# Altium footprint library MyPcbLib.PcbLib: 237 footprints (part 7 of 15)
Each footprint in its own frame and in the unit in brackets; x right, y up, seen from the top. Pads: shape width x height; smd on the part's side, far side on the other; paste and mask are expansions set on the pad; w line width, h text height; cw(c..) or ccw(c..) is an arc to the next point about the centre after c.
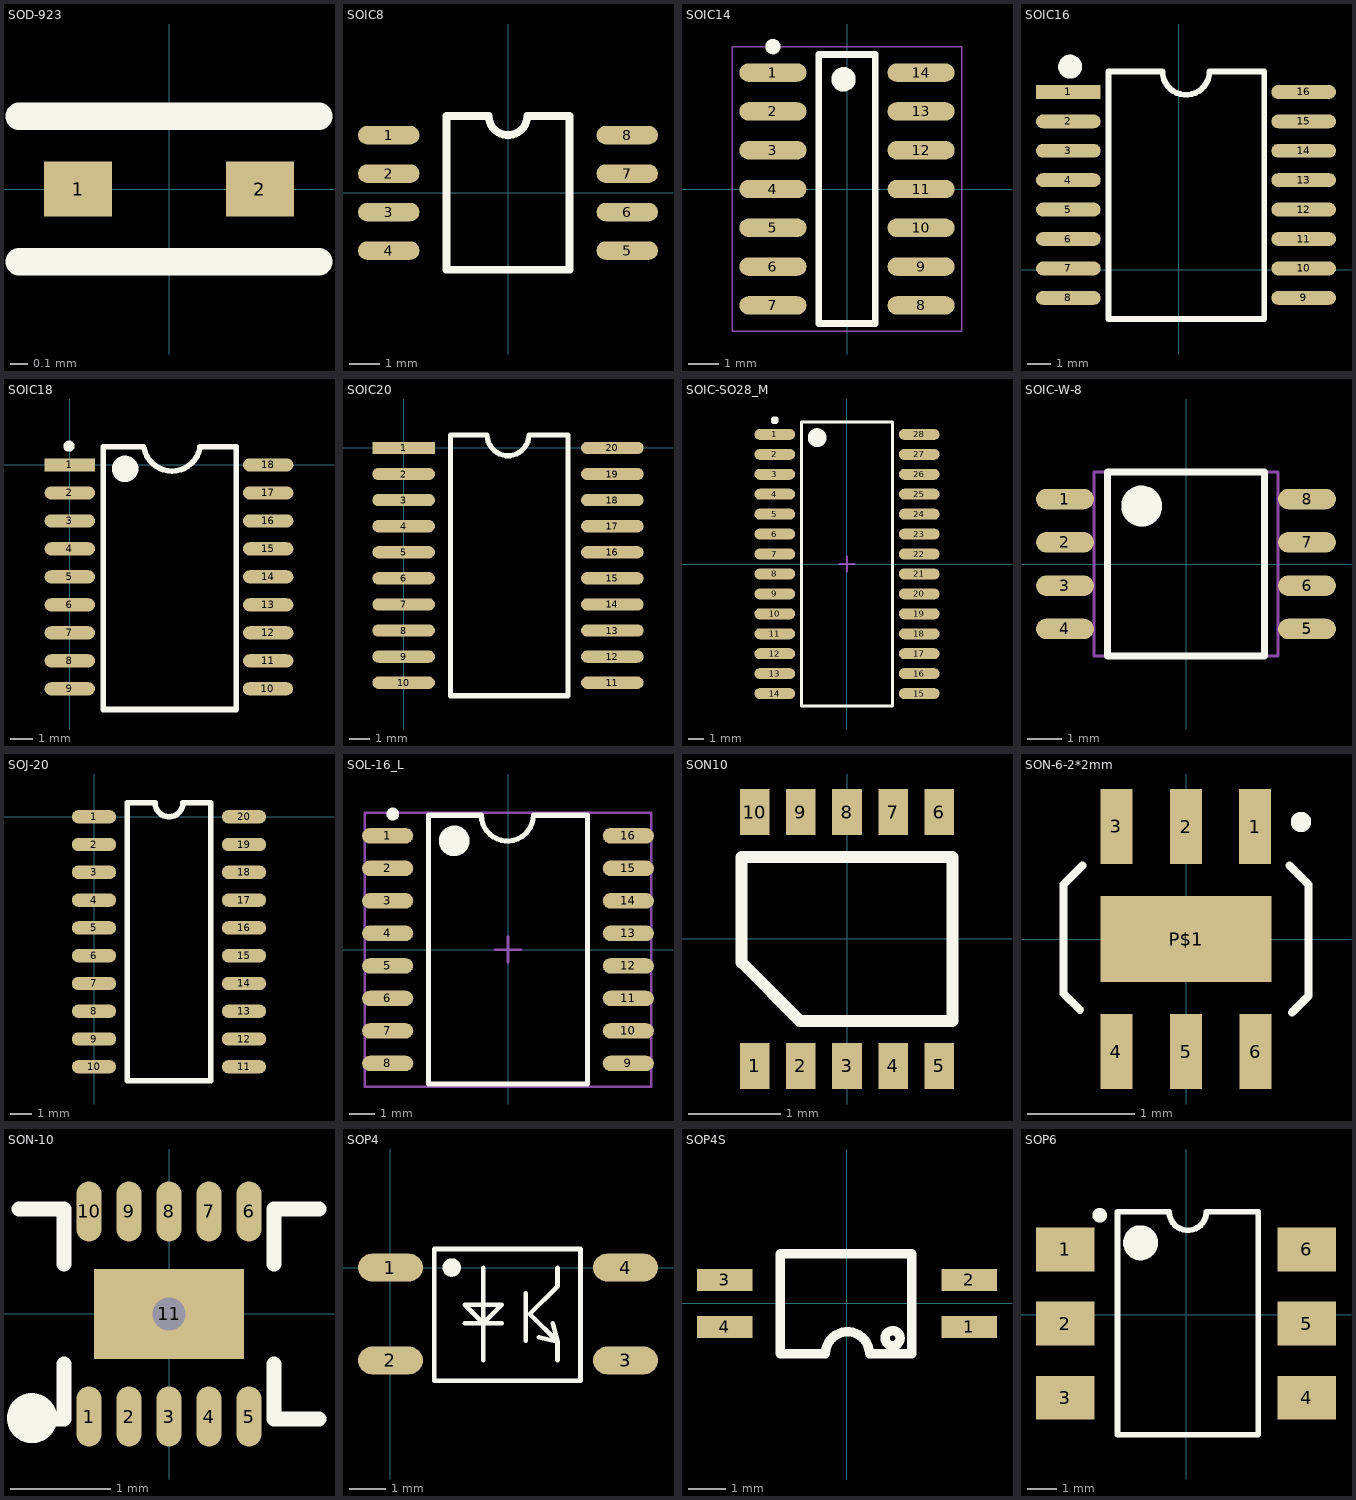
[diagram p6: the footprints below, top view; thin cyan lines are the x and y axes]

## SOD-923 [mil]
pads (2):
  rect 15x12 smd: 1(-20,0) 2(20,0)
Top Overlay:
  lines w6: -33,-16 33,-16 ; -33,16 33,16
3D body "SOD-923.STEP": height 15.75, standoff 0, extent -20.87,-12.7 20.47,12.8

## SOIC8 [mil]
pads (8):
  oval 80x24 smd: 1(-155,75) 2(-155,25) 3(-155,-25) 4(-155,-75) 5(155,-75) 6(155,-25) 7(155,25) 8(155,75)
Top Overlay:
  lines w10: -80,-100 -80,100 -25,100 ccw(c0,100) 25,100 80,100 80,-100 -80,-100
3D body "SOIC8.STEP": height 90.55, standoff -0.78, extent -167.2,-105.9 163.21,105.91

## SOIC14 [mm]
height 1.75
pads (14):
  oval 2.2x0.6 smd: 1(-2.425,3.81) 2(-2.425,2.54) 3(-2.425,1.27) 4(-2.425,0) 5(-2.425,-1.27) 6(-2.425,-2.54) 7(-2.425,-3.81) 8(2.425,-3.81) 9(2.425,-2.54) 10(2.425,-1.27) 11(2.425,0) 12(2.425,1.27) 13(2.425,2.54) 14(2.425,3.81)
Top Overlay:
  circle w0.4: c-0.115,3.59 r0.2
  circle w0.25: c-2.425,4.66 r0.125
  lines w0.22: -0.925,-4.4 0.925,-4.4 0.925,4.4 -0.925,4.4 -0.925,-4.4
Mechanical 15:
  lines w0.05: -3.75,-4.65 3.75,-4.65 3.75,4.65 -3.75,4.65 -3.75,-4.65
3D body "SOIC14.STEP": height 1.75, standoff 0, extent -2.896,-4.237 2.904,4.293

## SOIC16 [mil]
pads (16):
  rect 110x23.62 smd: 1(-188,302)
  oval 110x23.62 smd: 2(-188,252) 3(-188,202) 4(-188,152) 5(-188,102) 6(-188,52) 7(-188,2) 8(-188,-48) 9(212,-48) 10(212,2) 11(212,52) 12(212,102) 13(212,152) 14(212,202) 15(212,252) 16(212,302)
Top Overlay:
  lines w10: -120,335 -120,-84 145,-84 145,335 ; -120,337 -28,337 ccw(c12,337) 52,337 145,337
  lines w20: -195.28,345.79 ccw(c-185,345) -194.93,347.77
3D body "User Library-SOIC16_Wide_JEDEC_MS-013AA.step": height 108.23, standoff 3.9, extent -194.25,-79.69 224.25,333.69

## SOIC18 [mm]
height 2.36
pads (18):
  rect 2.286x0.6 smd: 1(0,0)
  oval 2.286x0.6 smd: 2(0,-1.27) 3(0,-2.54) 4(0,-3.81) 5(0,-5.08) 6(0,-6.35) 7(0,-7.62) 8(0,-8.89) 9(0,-10.16) 10(8.989,-10.16) 11(8.999,-8.89) 12(8.999,-7.62) 13(8.999,-6.35) 14(8.999,-5.08) 15(8.999,-3.81) 16(8.999,-2.54) 17(8.999,-1.27) 18(8.999,0)
Top Overlay:
  circle w0.25: c-0.041,0.85 r0.125
  circle w0.6: c2.509,-0.18 r0.3
  lines w0.254: 3.34,0.82 1.509,0.82 1.509,-11.1 7.559,-11.1 7.559,0.82 5.906,0.82 ; 3.364,0.764 ccw(c4.635,1.014) 5.906,0.762
3D body "PIC16F819-I-SOIC18 (1).step": height 2.31, standoff -0.2, extent -0.686,-10.845 9.654,0.685

## SOIC20 [mm]
pads (20):
  rect 3.048x0.6 smd: 1(0,0)
  oval 3.048x0.6 smd: 2(0,-1.27) 3(0,-2.54) 4(0,-3.81) 5(0,-5.08) 6(0,-6.35) 7(0,-7.62) 8(0,-8.89) 9(0,-10.16) 10(0,-11.43) 11(10.16,-11.43) 12(10.16,-10.16) 13(10.16,-8.89) 14(10.16,-7.62) 15(10.16,-6.35) 16(10.16,-5.08) 17(10.16,-3.81) 18(10.16,-2.54) 19(10.16,-1.27) 20(10.16,0)
Top Overlay:
  lines w0.254: 2.286,-12.065 8.001,-12.065 8.001,0.635 6.096,0.635 cw(c5.08,0.635) 4.064,0.635 2.286,0.635 2.286,-12.065
3D body "User Library-SOIC20-300.STEP": height 2.65, standoff 0, extent -0.045,-12.09 10.255,0.71

## SOIC-SO28_M [mm] "SOIC, 28-Leads, Body 17.9x7.5mm, Pitch 1.27mm, IPC Low Density"
height 2.65
pads (28):
  oval 2.6x0.7 smd: 1(-4.6,8.255) 2(-4.6,6.985) 3(-4.6,5.715) 4(-4.6,4.445) 5(-4.6,3.175) 6(-4.6,1.905) 7(-4.6,0.635) 8(-4.6,-0.635) 9(-4.6,-1.905) 10(-4.6,-3.175) 11(-4.6,-4.445) 12(-4.6,-5.715) 13(-4.6,-6.985) 14(-4.6,-8.255) 15(4.6,-8.255) 16(4.6,-6.985) 17(4.6,-5.715) 18(4.6,-4.445) 19(4.6,-3.175) 20(4.6,-1.905) 21(4.6,-0.635) 22(4.6,0.635) 23(4.6,1.905) 24(4.6,3.175) 25(4.6,4.445) 26(4.6,5.715) 27(4.6,6.985) 28(4.6,8.255)
Top Overlay:
  circle w0.6: c-1.9,8.05 r0.3
  circle w0.25: c-4.6,9.155 r0.125
  lines w0.2: -2.9,-9.05 2.9,-9.05 2.9,9.05 -2.9,9.05 -2.9,-9.05
Mechanical 15:
  lines w0.1: -0.5,0 0.5,0 ; 0,-0.5 0,0.5
3D body "User Library-80072036 SO28.STEP": height 2.63, standoff -0.01, extent -5.36,-9.012 5.31,9.068

## SOIC-W-8 [mm]
pads (8):
  oval 1.7x0.6 smd: 1(-3.55,1.905) 2(-3.55,0.635) 3(-3.55,-0.635) 4(-3.55,-1.905) 5(3.55,-1.905) 6(3.55,-0.635) 7(3.55,0.635) 8(3.55,1.905)
Top Overlay:
  circle w0.6: c-1.3,1.7 r0.3
  lines w0.2: -2.3,-2.7 2.3,-2.7 2.3,2.7 -2.3,2.7 -2.3,-2.7
Mechanical 13:
  circle w0.1: c-1.27,1.651 r0.5
  lines w0.1: -2.7,-2.7 2.7,-2.7 2.7,2.7 -2.7,2.7 -2.7,-2.7
3D body "SOIC-W-8.step": height 2.16, standoff 0, extent -3.95,-2.7 3.95,2.7

## SOJ-20 [mil]
pads (20):
  oval 80x24 smd: 1(0,0) 2(0,-50) 3(0,-100) 4(0,-150) 5(0,-200) 6(0,-250) 7(0,-300) 8(0,-350) 9(0,-400) 10(0,-450) 11(270,-450) 12(270,-400) 13(270,-350) 14(270,-300) 15(270,-250) 16(270,-200) 17(270,-150) 18(270,-100) 19(270,-50) 20(270,0)
Top Overlay:
  lines w10: 60,-475 60,25 110,25 ccw(c135,25) 160,25 210,25 210,-475 60,-475
3D body "Soj20.STEP": height 78.74, standoff 0, extent -6.64,-468.36 275.4,23.77

## SOL-16_L [mm] "16-Pin Small Outline Integrated Circuit 1.27 mm Pitch, IPC High Density"
height 2.65
pads (16):
  oval 2x0.6 smd: 1(-4.7,4.445) 2(-4.7,3.175) 3(-4.7,1.905) 4(-4.7,0.635) 5(-4.7,-0.635) 6(-4.7,-1.905) 7(-4.7,-3.175) 8(-4.7,-4.445) 9(4.7,-4.445) 10(4.7,-3.175) 11(4.7,-1.905) 12(4.7,-0.635) 13(4.7,0.635) 14(4.7,1.905) 15(4.7,3.175) 16(4.7,4.445)
Top Overlay:
  circle w0.25: c-4.5,5.295 r0.125
  circle w0.6: c-2.1,4.25 r0.3
  lines w0.2: -1.084,5.25 -3.1,5.25 -3.1,-5.25 3.1,-5.25 3.1,5.25 1.008,5.25 ; -1.042,5.25 ccw(c-0.025,5.258) 0.991,5.258
Mechanical 15:
  lines w0.1: -0.5,0 0.5,0 ; 0,-0.5 0,0.5 ; -5.6,-5.35 -5.6,5.35 5.6,5.35 5.6,-5.35 -5.6,-5.35
3D body "User Library-SOIC16-300.STEP": height 2.65, standoff 0, extent -5.182,-5.144 5.118,5.156

## SON10 [mm]
pads (10):
  rect 0.32x0.5 smd: 1(-1,-1.375) 2(-0.5,-1.375) 3(0,-1.375) 4(0.5,-1.375) 5(1,-1.375) 6(1,1.375) 7(0.5,1.375) 8(0,1.375) 9(-0.5,1.375) 10(-1,1.375)
Top Overlay:
  lines w0.127: -1.143,-0.254 -0.508,-0.889 1.143,-0.889 1.143,0.889 -1.143,0.889 -1.143,-0.254
3D body "User Library-DRC (S-PVSON-N10)-1.STEP": height 1, standoff 0, extent -1.575,-1.6 1.575,1.55

## SON-6-2*2mm [mm] "SON PAKCAGE [TPS62291]"
pads (7):
  rect 0.3x0.7 smd: 1(0.645,1.05) 2(0,1.05) 3(-0.65,1.05) 4(-0.65,-1.05) 5(0,-1.05) 6(0.65,-1.05)
  rect 1.6x0.8 smd: P$1(0,0)
Top Overlay:
  circle w0.1: c1.073,1.092 r0.045
  lines w0.076: -0.991,-0.66 -1.143,-0.508 -1.143,0.508 -0.965,0.686 ; 0.965,0.686 1.143,0.508 1.143,-0.533 0.991,-0.686
3D body "User Library-QFN6.STEP": height 0.75, standoff 0, extent -1,-0.972 1,1.03

## SON-10 [mm]
height 0.8
pads (11):
  oval 0.25x0.6 smd: 1(-0.8,-1.025) 2(-0.4,-1.025) 3(0,-1.025) 4(0.4,-1.025) 5(0.8,-1.025) 6(0.8,1.025) 7(0.4,1.025) 8(0,1.025) 9(-0.4,1.025) 10(-0.8,1.025)
  rect 1.5x0.9 smd: 11(0,0)
via 0,0 diameter 0.66 hole 0.33
Top Overlay:
  circle w0.25: c-1.37,-1.041 r0.125
  lines w0.152: -1.5,-1.05 -1.05,-1.05 -1.05,-0.5 ; -1.5,1.05 -1.05,1.05 -1.05,0.5 ; 1.05,-0.5 1.05,-1.05 1.5,-1.05 ; 1.05,0.5 1.05,1.05 1.5,1.05
3D body "SON-10.STEP": height 0.8, standoff 0, extent -1.05,-1.055 1.05,1.055

## SOP4 [mil] "AQY211G2S"
pads (4):
  oval 70x30 smd: 1(0,0) 2(0,-100) 3(253.23,-100) 4(253.23,0)
Top Overlay:
  circle w10: c65.94,0 r4.92
  lines w5: 80,-60 120,-60 ; 100,-100 100,0 ; 145.67,-78.74 145.67,-27.56 ; 160,-75 180,-80 ; 175,-60 180,-80 ; 180,-100 180,-80 ; 180,0 180,-20 150,-50 180,-80 ; 47.24,-121.73 47.24,20 204.72,20 204.72,-121.73 47.24,-121.73 ; 80,-40 120,-40 100,-60 80,-40
3D body "User Library-HCPL-181-1.STEP": height 78.74, standoff -3.96, extent -7.87,-122.05 267.72,19.69

## SOP4S [mm]
pads (4):
  rect 1.5x0.6 smd: 1(3.31,-0.635) 2(3.31,0.635) 3(-3.309,0.635) 4(-3.309,-0.635)
Top Overlay:
  circle w0.254: c1.235,-0.94 r0.203
  lines w0.254: -1.805,-1.361 -1.805,1.346 ; -1.794,-1.361 -0.582,-1.361 cw(c0.013,-1.361) 0.608,-1.361 1.751,-1.361 1.751,1.346 -1.786,1.346
3D body "SOP-4-1.step": height 2.1, standoff 0, extent -3.492,-1.397 3.507,1.403

## SOP6 [mm]
pads (6):
  rect 2x1.5 smd: 1(-4.14,2.235) 2(-4.14,-0.305) 3(-4.14,-2.845) 4(4.14,-2.845) 5(4.14,-0.305) 6(4.14,2.235)
Top Overlay:
  circle w0.6: c-1.557,2.464 r0.3
  circle w0.25: c-2.957,3.404 r0.125
  lines w0.2: -2.349,-4.115 2.476,-4.115 2.476,3.524 0.699,3.524 cw(c0.064,3.524) -0.572,3.524 -2.349,3.524 -2.349,-4.115
3D body "User Library-SOP-6.step": height 4, standoff -0.08, extent -4.532,-4.548 4.633,3.962